# Altium schematic symbol library MCU_ST_STM32F4.SchLib: 211 symbols (part 8 of 10)
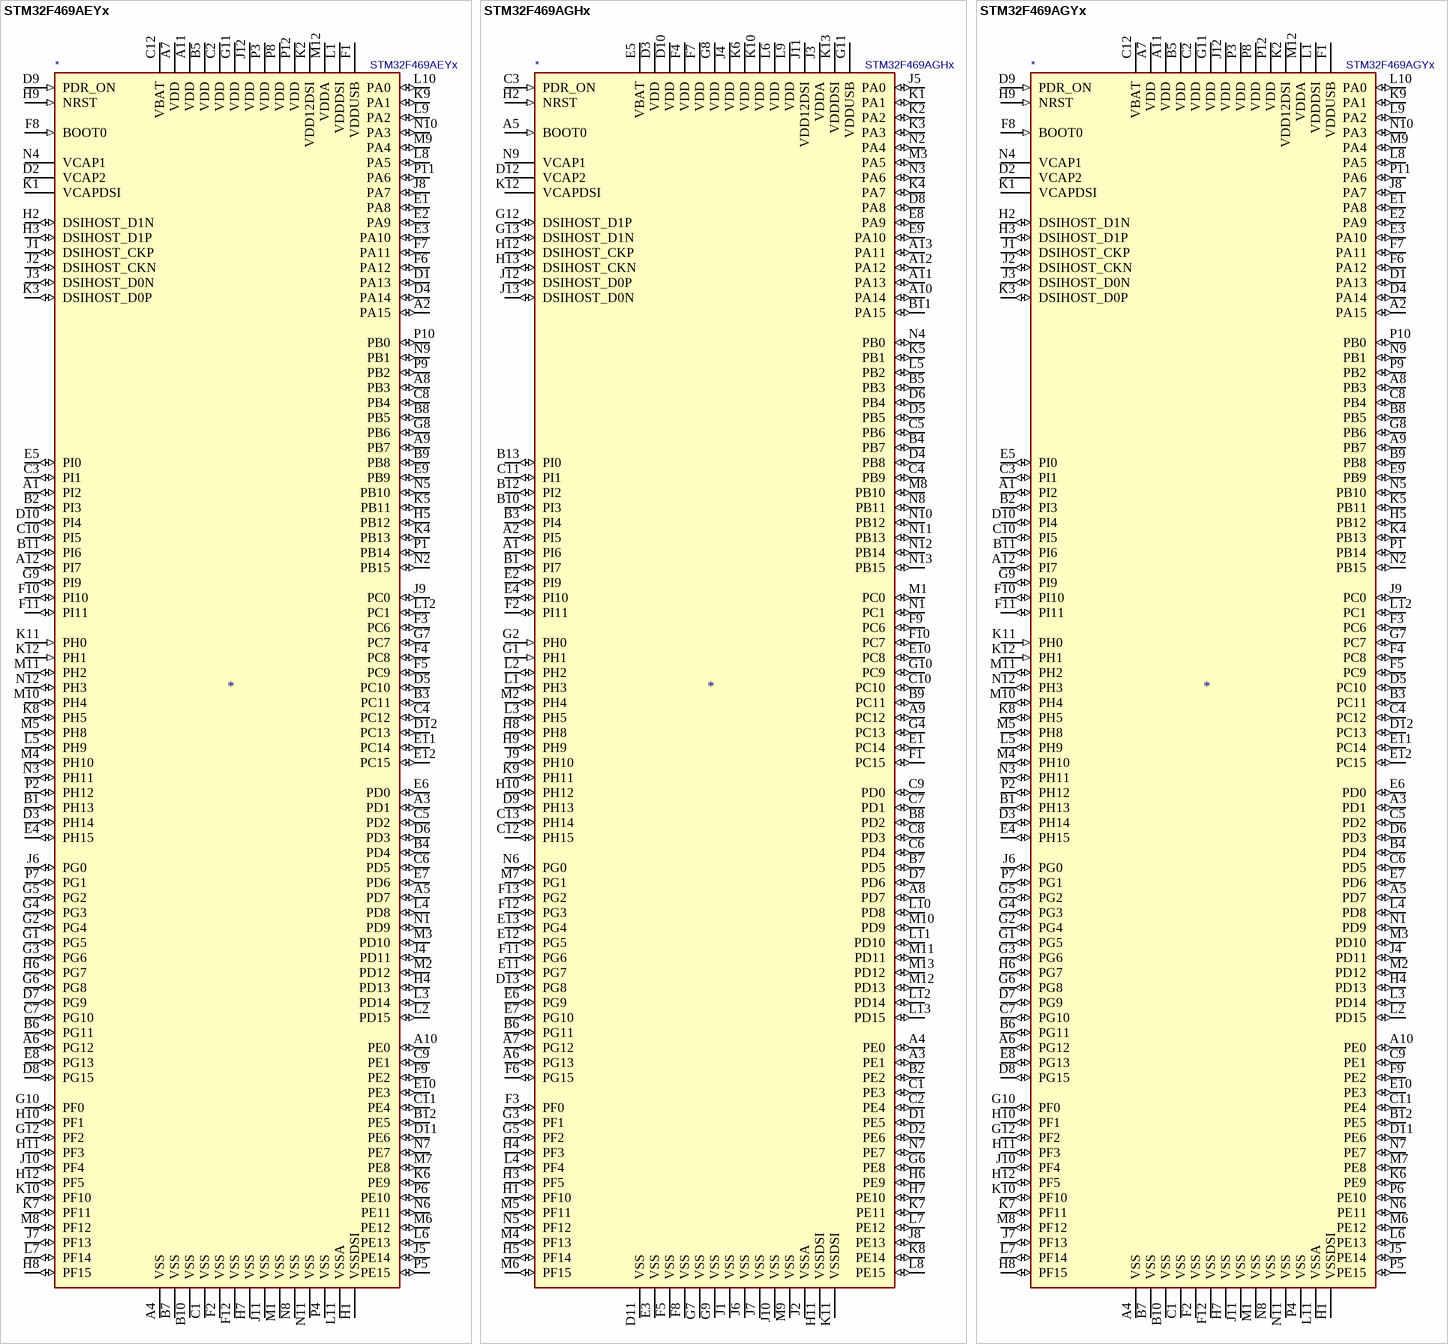
[diagram p69: symbols STM32F469AEYx to STM32F469AGYx]

## STM32F469AEYx
designator *  value STM32F469AEYx
ki_keywords: ARM Cortex-M4 STM32F4 STM32F469/479; ki_description: ARM Cortex-M4 MCU, 512KB flash, 320KB RAM, 180MHz, 1.7-3.6V, 128 GPIO, WLCSP-168; ki_fp_filters: ST_WLCSP*Die434*; Footprint: Package_CSP:ST_WLCSP-168_Die434; Supplier: http://www.st.com/st-web-ui/static/active/en/resource/technical/document/datasheet/DM00219980.pdf
footprint ST_WLCSP-168_Die434
pins: A1 PI2 (io), A2 PA15 (io), A3 PD1 (io), A4 VSS (power), A5 PD7 (io), A6 PG12 (io), A7 VDD (power), A8 PB3 (io), A9 PB7 (io), A10 PE0 (io), A11 VDD (power), A12 PI7 (io), B1 PH13 (io), B2 PI3 (io), B3 PC11 (io), B4 PD4 (io), B5 VDD (power), B6 PG11 (io), B7 VSS (power), B8 PB5 (io), B9 PB8 (io), B10 VSS (power), B11 PI6 (io), B12 PE5 (io), C1 VSS (power), C2 VDD (power), C3 PI1 (io), C4 PC12 (io), C5 PD2 (io), C6 PD5 (io), C7 PG10 (io), C8 PB4 (io), C9 PE1 (io), C10 PI5 (io), C11 PE4 (io), C12 VBAT (power), D1 PA13 (io), D2 VCAP2 (power), D3 PH14 (io), D4 PA14 (io), D5 PC10 (io), D6 PD3 (io), D7 PG9 (io), D8 PG15 (io), D9 PDR_ON (in), D10 PI4 (io), D11 PE6 (io), D12 PC13 (io), E1 PA8 (io), E2 PA9 (io), E3 PA10 (io), E4 PH15 (io), E5 PI0 (io), E6 PD0 (io), E7 PD6 (io), E8 PG13 (io), E9 PB9 (io), E10 PE3 (io), E11 PC14 (io), E12 PC15 (io), F1 VDDUSB (power), F2 VSS (power), F3 PC6 (io), F4 PC8 (io), F5 PC9 (io), F6 PA12 (io), F7 PA11 (io), F8 BOOT0 (in), F9 PE2 (io), F10 PI10 (io), F11 PI11 (io), F12 VSS (power), G1 PG5 (io), G2 PG4 (io), G3 PG6 (io), G4 PG3 (io), G5 PG2 (io), G6 PG8 (io), G7 PC7 (io), G8 PB6 (io), G9 PI9 (io), G10 PF0 (io), G11 VDD (power), G12 PF2 (io), H1 VSSDSI (power), H2 DSIHOST_D1N (io), H3 DSIHOST_D1P (io), H4 PD13 (io), H5 PB12 (io), H6 PG7 (io), H7 VSS (power), H8 PF15 (io), H9 NRST (in), H10 PF1 (io), H11 PF3 (io), H12 PF5 (io), J1 DSIHOST_CKP (io), J2 DSIHOST_CKN (io), J3 DSIHOST_D0N (io), J4 PD11 (io), J5 PE14 (io), J6 PG0 (io), J7 PF13 (io), J8 PA7 (io), J9 PC0 (io), J10 PF4 (io), J11 VSS (power), J12 VDD (power), K1 VCAPDSI (power), K2 VDD12DSI (power), K3 DSIHOST_D0P (io), K4 PB13 (io), K5 PB11 (io), K6 PE9 (io), K7 PF11 (io), K8 PH5 (io), K9 PA1 (io), K10 PF10 (io), K11 PH0 (in), K12 PH1 (in), L1 VDDDSI (power), L2 PD15 (io), L3 PD14 (io), L4 PD8 (io), L5 PH9 (io), L6 PE13 (io), L7 PF14 (io), L8 PA5 (io), L9 PA2 (io), L10 PA0 (io), L11 VSSA (power), L12 PC1 (io), M1 VSS (power), M2 PD12 (io), M3 PD10 (io), M4 PH10 (io), M5 PH8 (io), M6 PE12 (io), M7 PE8 (io), M8 PF12 (io), M9 PA4 (io), M10 PH4 (io), M11 PH2 (io), M12 VDDA (power), N1 PD9 (io), N2 PB15 (io), N3 PH11 (io), N4 VCAP1 (power), N5 PB10 (io), N6 PE11 (io), N7 PE7 (io), N8 VSS (power), N9 PB1 (io), N10 PA3 (io), N11 VSS (power), N12 PH3 (io), P1 PB14 (io), P2 PH12 (io), P3 VDD (power), P4 VSS (power), P5 PE15 (io), P6 PE10 (io), P7 PG1 (io), P8 VDD (power), P9 PB2 (io), P10 PB0 (io), P11 PA6 (io), P12 VDD (power)

## STM32F469AGHx
designator *  value STM32F469AGHx
ki_keywords: ARM Cortex-M4 STM32F4 STM32F469/479; ki_description: ARM Cortex-M4 MCU, 1024KB flash, 320KB RAM, 180MHz, 1.7-3.6V, 128 GPIO, UFBGA-169; ki_fp_filters: UFBGA*7x7mm*Layout13x13*P0.5mm*; Footprint: Package_BGA:UFBGA-169_7x7mm_Layout13x13_P0.5mm; Supplier: http://www.st.com/st-web-ui/static/active/en/resource/technical/document/datasheet/DM00219980.pdf
footprint UFBGA-169_7x7mm_Layout13x13_P0.5mm
pins: A1 PI6 (io), A2 PI5 (io), A3 PE1 (io), A4 PE0 (io), A5 BOOT0 (in), A6 PG13 (io), A7 PG12 (io), A8 PD7 (io), A9 PC12 (io), A10 PA14 (io), A11 PA13 (io), A12 PA12 (io), A13 PA11 (io), B1 PI7 (io), B2 PE2 (io), B3 PI4 (io), B4 PB7 (io), B5 PB3 (io), B6 PG11 (io), B7 PD5 (io), B8 PD2 (io), B9 PC11 (io), B10 PI3 (io), B11 PA15 (io), B12 PI2 (io), B13 PI0 (io), C1 PE3 (io), C2 PE4 (io), C3 PDR_ON (in), C4 PB9 (io), C5 PB6 (io), C6 PD4 (io), C7 PD1 (io), C8 PD3 (io), C9 PD0 (io), C10 PC10 (io), C11 PI1 (io), C12 PH15 (io), C13 PH14 (io), D1 PE5 (io), D2 PE6 (io), D3 VDD (power), D4 PB8 (io), D5 PB5 (io), D6 PB4 (io), D7 PD6 (io), D8 PA8 (io), D9 PH13 (io), D10 VDD (power), D11 VSS (power), D12 VCAP2 (power), D13 PG8 (io), E1 PC14 (io), E2 PI9 (io), E3 VSS (power), E4 PI10 (io), E5 VBAT (power), E6 PG9 (io), E7 PG10 (io), E8 PA9 (io), E9 PA10 (io), E10 PC8 (io), E11 PG7 (io), E12 PG5 (io), E13 PG4 (io), F1 PC15 (io), F2 PI11 (io), F3 PF0 (io), F4 VDD (power), F5 VSS (power), F6 PG15 (io), F7 VDD (power), F8 VSS (power), F9 PC6 (io), F10 PC7 (io), F11 PG6 (io), F12 PG3 (io), F13 PG2 (io), G1 PH1 (in), G2 PH0 (in), G3 PF1 (io), G4 PC13 (io), G5 PF2 (io), G6 PE8 (io), G7 VSS (power), G8 VDD (power), G9 VSS (power), G10 PC9 (io), G11 VDDUSB (power), G12 DSIHOST_D1P (io), G13 DSIHOST_D1N (io), H1 PF10 (io), H2 NRST (in), H3 PF5 (io), H4 PF3 (io), H5 PF14 (io), H6 PE9 (io), H7 PE10 (io), H8 PH8 (io), H9 PH9 (io), H10 PH12 (io), H11 VSSDSI (power), H12 DSIHOST_CKP (io), H13 DSIHOST_CKN (io), J1 VSS (power), J2 VSSA (power), J3 VDDA (power), J4 VDD (power), J5 PA0 (io), J6 VSS (power), J7 VSS (power), J8 PE13 (io), J9 PH10 (io), J10 VSS (power), J11 VDD12DSI (power), J12 DSIHOST_D0P (io), J13 DSIHOST_D0N (io), K1 PA1 (io), K2 PA2 (io), K3 PA3 (io), K4 PA7 (io), K5 PB1 (io), K6 VDD (power), K7 PE11 (io), K8 PE14 (io), K9 PH11 (io), K10 VDD (power), K11 VSSDSI (power), K12 VCAPDSI (power), K13 VDDDSI (power), L1 PH3 (io), L2 PH2 (io), L3 PH5 (io), L4 PF4 (io), L5 PB2 (io), L6 VDD (power), L7 PE12 (io), L8 PE15 (io), L9 VDD (power), L10 PD8 (io), L11 PD10 (io), L12 PD14 (io), L13 PD15 (io), M1 PC0 (io), M2 PH4 (io), M3 PA5 (io), M4 PF13 (io), M5 PF11 (io), M6 PF15 (io), M7 PG1 (io), M8 PB10 (io), M9 VSS (power), M10 PD9 (io), M11 PD11 (io), M12 PD13 (io), M13 PD12 (io), N1 PC1 (io), N2 PA4 (io), N3 PA6 (io), N4 PB0 (io), N5 PF12 (io), N6 PG0 (io), N7 PE7 (io), N8 PB11 (io), N9 VCAP1 (power), N10 PB12 (io), N11 PB13 (io), N12 PB14 (io), N13 PB15 (io)

## STM32F469AGYx
designator *  value STM32F469AGYx
ki_keywords: ARM Cortex-M4 STM32F4 STM32F469/479; ki_description: ARM Cortex-M4 MCU, 1024KB flash, 320KB RAM, 180MHz, 1.7-3.6V, 128 GPIO, WLCSP-168; ki_fp_filters: ST_WLCSP*Die434*; Footprint: Package_CSP:ST_WLCSP-168_Die434; Supplier: http://www.st.com/st-web-ui/static/active/en/resource/technical/document/datasheet/DM00219980.pdf
footprint ST_WLCSP-168_Die434
pins: A1 PI2 (io), A2 PA15 (io), A3 PD1 (io), A4 VSS (power), A5 PD7 (io), A6 PG12 (io), A7 VDD (power), A8 PB3 (io), A9 PB7 (io), A10 PE0 (io), A11 VDD (power), A12 PI7 (io), B1 PH13 (io), B2 PI3 (io), B3 PC11 (io), B4 PD4 (io), B5 VDD (power), B6 PG11 (io), B7 VSS (power), B8 PB5 (io), B9 PB8 (io), B10 VSS (power), B11 PI6 (io), B12 PE5 (io), C1 VSS (power), C2 VDD (power), C3 PI1 (io), C4 PC12 (io), C5 PD2 (io), C6 PD5 (io), C7 PG10 (io), C8 PB4 (io), C9 PE1 (io), C10 PI5 (io), C11 PE4 (io), C12 VBAT (power), D1 PA13 (io), D2 VCAP2 (power), D3 PH14 (io), D4 PA14 (io), D5 PC10 (io), D6 PD3 (io), D7 PG9 (io), D8 PG15 (io), D9 PDR_ON (in), D10 PI4 (io), D11 PE6 (io), D12 PC13 (io), E1 PA8 (io), E2 PA9 (io), E3 PA10 (io), E4 PH15 (io), E5 PI0 (io), E6 PD0 (io), E7 PD6 (io), E8 PG13 (io), E9 PB9 (io), E10 PE3 (io), E11 PC14 (io), E12 PC15 (io), F1 VDDUSB (power), F2 VSS (power), F3 PC6 (io), F4 PC8 (io), F5 PC9 (io), F6 PA12 (io), F7 PA11 (io), F8 BOOT0 (in), F9 PE2 (io), F10 PI10 (io), F11 PI11 (io), F12 VSS (power), G1 PG5 (io), G2 PG4 (io), G3 PG6 (io), G4 PG3 (io), G5 PG2 (io), G6 PG8 (io), G7 PC7 (io), G8 PB6 (io), G9 PI9 (io), G10 PF0 (io), G11 VDD (power), G12 PF2 (io), H1 VSSDSI (power), H2 DSIHOST_D1N (io), H3 DSIHOST_D1P (io), H4 PD13 (io), H5 PB12 (io), H6 PG7 (io), H7 VSS (power), H8 PF15 (io), H9 NRST (in), H10 PF1 (io), H11 PF3 (io), H12 PF5 (io), J1 DSIHOST_CKP (io), J2 DSIHOST_CKN (io), J3 DSIHOST_D0N (io), J4 PD11 (io), J5 PE14 (io), J6 PG0 (io), J7 PF13 (io), J8 PA7 (io), J9 PC0 (io), J10 PF4 (io), J11 VSS (power), J12 VDD (power), K1 VCAPDSI (power), K2 VDD12DSI (power), K3 DSIHOST_D0P (io), K4 PB13 (io), K5 PB11 (io), K6 PE9 (io), K7 PF11 (io), K8 PH5 (io), K9 PA1 (io), K10 PF10 (io), K11 PH0 (in), K12 PH1 (in), L1 VDDDSI (power), L2 PD15 (io), L3 PD14 (io), L4 PD8 (io), L5 PH9 (io), L6 PE13 (io), L7 PF14 (io), L8 PA5 (io), L9 PA2 (io), L10 PA0 (io), L11 VSSA (power), L12 PC1 (io), M1 VSS (power), M2 PD12 (io), M3 PD10 (io), M4 PH10 (io), M5 PH8 (io), M6 PE12 (io), M7 PE8 (io), M8 PF12 (io), M9 PA4 (io), M10 PH4 (io), M11 PH2 (io), M12 VDDA (power), N1 PD9 (io), N2 PB15 (io), N3 PH11 (io), N4 VCAP1 (power), N5 PB10 (io), N6 PE11 (io), N7 PE7 (io), N8 VSS (power), N9 PB1 (io), N10 PA3 (io), N11 VSS (power), N12 PH3 (io), P1 PB14 (io), P2 PH12 (io), P3 VDD (power), P4 VSS (power), P5 PE15 (io), P6 PE10 (io), P7 PG1 (io), P8 VDD (power), P9 PB2 (io), P10 PB0 (io), P11 PA6 (io), P12 VDD (power)

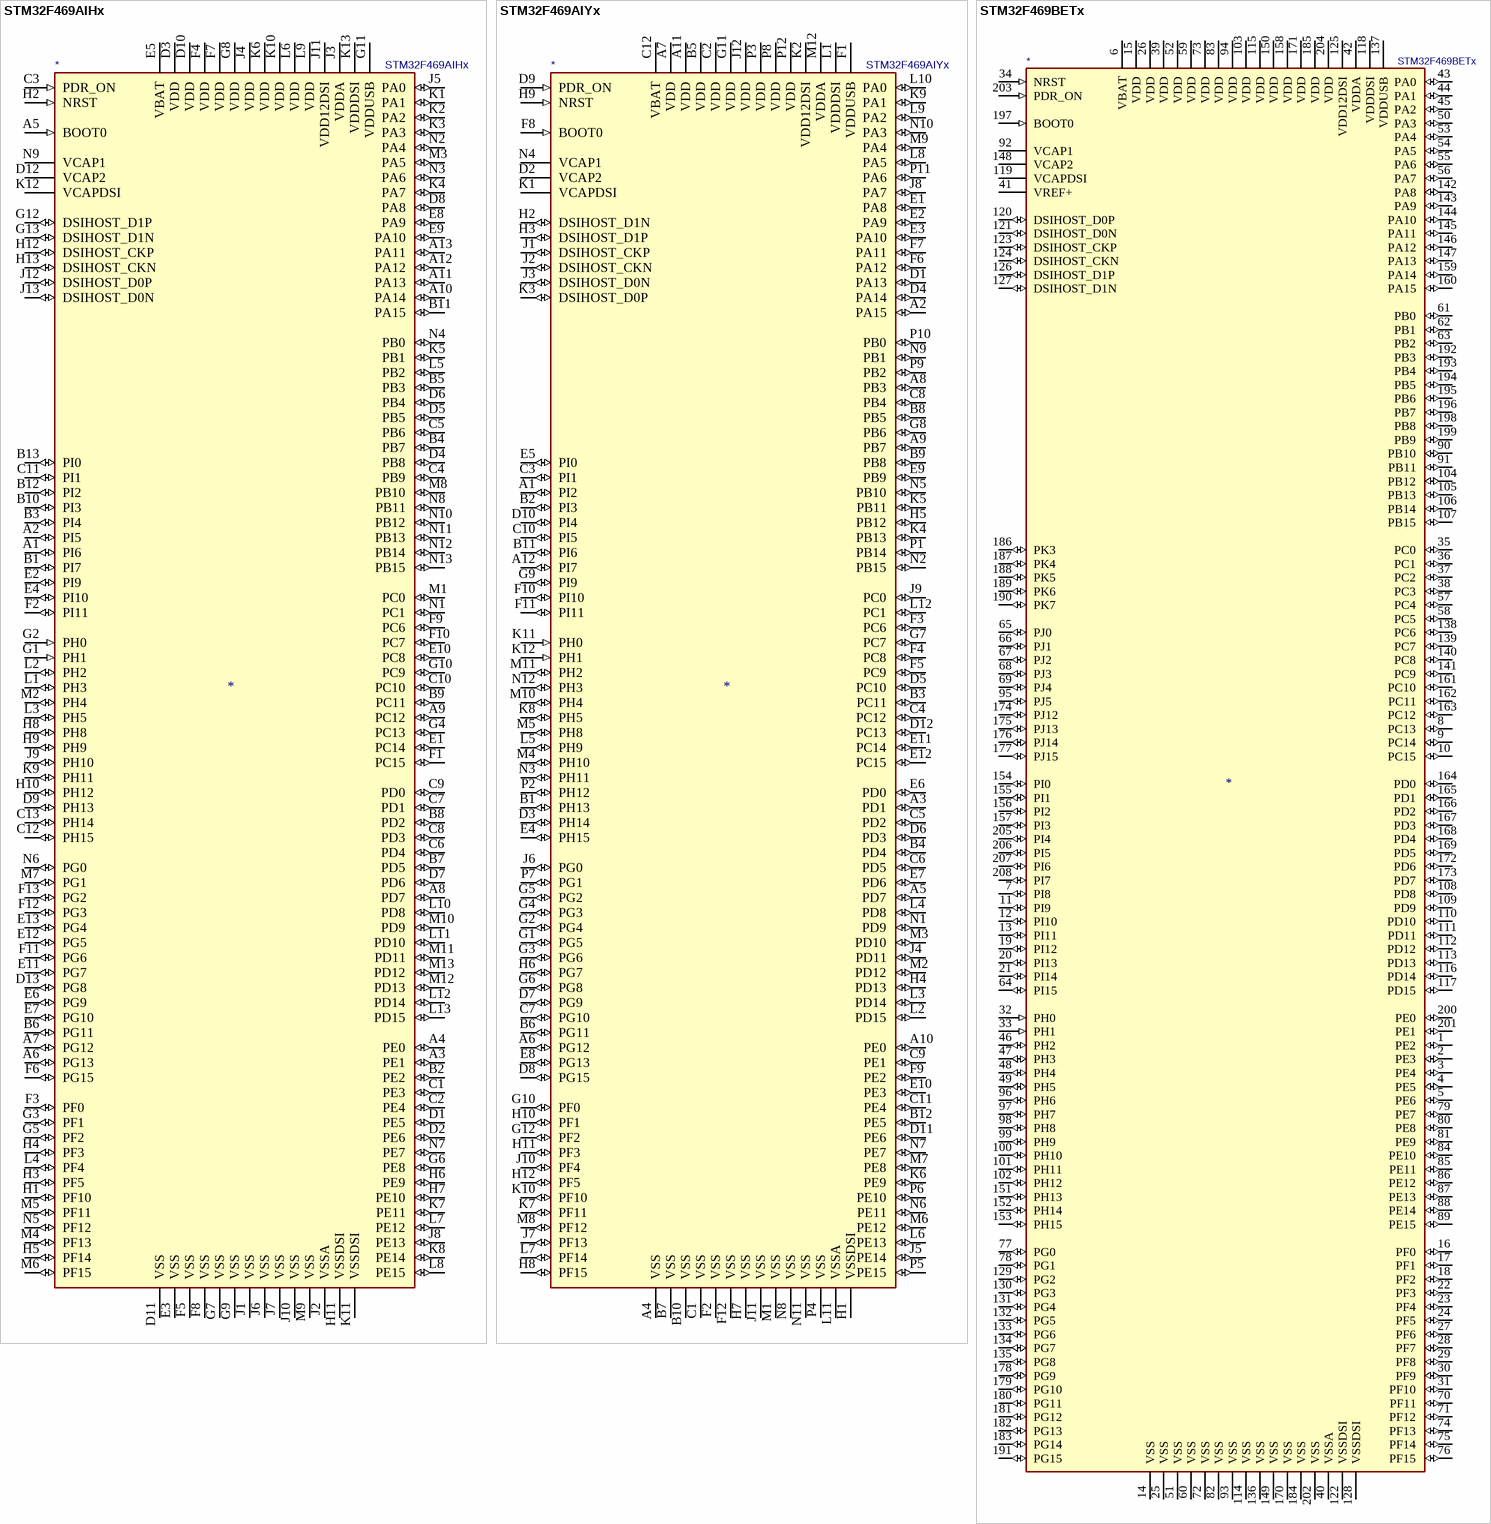
[diagram p48: symbols STM32F469AIHx to STM32F469BETx]

## STM32F469AIHx
designator *  value STM32F469AIHx
ki_keywords: ARM Cortex-M4 STM32F4 STM32F469/479; ki_description: ARM Cortex-M4 MCU, 2048KB flash, 320KB RAM, 180MHz, 1.7-3.6V, 128 GPIO, UFBGA-169; ki_fp_filters: UFBGA*7x7mm*Layout13x13*P0.5mm*; Footprint: Package_BGA:UFBGA-169_7x7mm_Layout13x13_P0.5mm; Supplier: http://www.st.com/st-web-ui/static/active/en/resource/technical/document/datasheet/DM00219980.pdf
footprint UFBGA-169_7x7mm_Layout13x13_P0.5mm
pins: A1 PI6 (io), A2 PI5 (io), A3 PE1 (io), A4 PE0 (io), A5 BOOT0 (in), A6 PG13 (io), A7 PG12 (io), A8 PD7 (io), A9 PC12 (io), A10 PA14 (io), A11 PA13 (io), A12 PA12 (io), A13 PA11 (io), B1 PI7 (io), B2 PE2 (io), B3 PI4 (io), B4 PB7 (io), B5 PB3 (io), B6 PG11 (io), B7 PD5 (io), B8 PD2 (io), B9 PC11 (io), B10 PI3 (io), B11 PA15 (io), B12 PI2 (io), B13 PI0 (io), C1 PE3 (io), C2 PE4 (io), C3 PDR_ON (in), C4 PB9 (io), C5 PB6 (io), C6 PD4 (io), C7 PD1 (io), C8 PD3 (io), C9 PD0 (io), C10 PC10 (io), C11 PI1 (io), C12 PH15 (io), C13 PH14 (io), D1 PE5 (io), D2 PE6 (io), D3 VDD (power), D4 PB8 (io), D5 PB5 (io), D6 PB4 (io), D7 PD6 (io), D8 PA8 (io), D9 PH13 (io), D10 VDD (power), D11 VSS (power), D12 VCAP2 (power), D13 PG8 (io), E1 PC14 (io), E2 PI9 (io), E3 VSS (power), E4 PI10 (io), E5 VBAT (power), E6 PG9 (io), E7 PG10 (io), E8 PA9 (io), E9 PA10 (io), E10 PC8 (io), E11 PG7 (io), E12 PG5 (io), E13 PG4 (io), F1 PC15 (io), F2 PI11 (io), F3 PF0 (io), F4 VDD (power), F5 VSS (power), F6 PG15 (io), F7 VDD (power), F8 VSS (power), F9 PC6 (io), F10 PC7 (io), F11 PG6 (io), F12 PG3 (io), F13 PG2 (io), G1 PH1 (in), G2 PH0 (in), G3 PF1 (io), G4 PC13 (io), G5 PF2 (io), G6 PE8 (io), G7 VSS (power), G8 VDD (power), G9 VSS (power), G10 PC9 (io), G11 VDDUSB (power), G12 DSIHOST_D1P (io), G13 DSIHOST_D1N (io), H1 PF10 (io), H2 NRST (in), H3 PF5 (io), H4 PF3 (io), H5 PF14 (io), H6 PE9 (io), H7 PE10 (io), H8 PH8 (io), H9 PH9 (io), H10 PH12 (io), H11 VSSDSI (power), H12 DSIHOST_CKP (io), H13 DSIHOST_CKN (io), J1 VSS (power), J2 VSSA (power), J3 VDDA (power), J4 VDD (power), J5 PA0 (io), J6 VSS (power), J7 VSS (power), J8 PE13 (io), J9 PH10 (io), J10 VSS (power), J11 VDD12DSI (power), J12 DSIHOST_D0P (io), J13 DSIHOST_D0N (io), K1 PA1 (io), K2 PA2 (io), K3 PA3 (io), K4 PA7 (io), K5 PB1 (io), K6 VDD (power), K7 PE11 (io), K8 PE14 (io), K9 PH11 (io), K10 VDD (power), K11 VSSDSI (power), K12 VCAPDSI (power), K13 VDDDSI (power), L1 PH3 (io), L2 PH2 (io), L3 PH5 (io), L4 PF4 (io), L5 PB2 (io), L6 VDD (power), L7 PE12 (io), L8 PE15 (io), L9 VDD (power), L10 PD8 (io), L11 PD10 (io), L12 PD14 (io), L13 PD15 (io), M1 PC0 (io), M2 PH4 (io), M3 PA5 (io), M4 PF13 (io), M5 PF11 (io), M6 PF15 (io), M7 PG1 (io), M8 PB10 (io), M9 VSS (power), M10 PD9 (io), M11 PD11 (io), M12 PD13 (io), M13 PD12 (io), N1 PC1 (io), N2 PA4 (io), N3 PA6 (io), N4 PB0 (io), N5 PF12 (io), N6 PG0 (io), N7 PE7 (io), N8 PB11 (io), N9 VCAP1 (power), N10 PB12 (io), N11 PB13 (io), N12 PB14 (io), N13 PB15 (io)

## STM32F469AIYx
designator *  value STM32F469AIYx
ki_keywords: ARM Cortex-M4 STM32F4 STM32F469/479; ki_description: ARM Cortex-M4 MCU, 2048KB flash, 320KB RAM, 180MHz, 1.7-3.6V, 128 GPIO, WLCSP-168; ki_fp_filters: ST_WLCSP*Die434*; Footprint: Package_CSP:ST_WLCSP-168_Die434; Supplier: http://www.st.com/st-web-ui/static/active/en/resource/technical/document/datasheet/DM00219980.pdf
footprint ST_WLCSP-168_Die434
pins: A1 PI2 (io), A2 PA15 (io), A3 PD1 (io), A4 VSS (power), A5 PD7 (io), A6 PG12 (io), A7 VDD (power), A8 PB3 (io), A9 PB7 (io), A10 PE0 (io), A11 VDD (power), A12 PI7 (io), B1 PH13 (io), B2 PI3 (io), B3 PC11 (io), B4 PD4 (io), B5 VDD (power), B6 PG11 (io), B7 VSS (power), B8 PB5 (io), B9 PB8 (io), B10 VSS (power), B11 PI6 (io), B12 PE5 (io), C1 VSS (power), C2 VDD (power), C3 PI1 (io), C4 PC12 (io), C5 PD2 (io), C6 PD5 (io), C7 PG10 (io), C8 PB4 (io), C9 PE1 (io), C10 PI5 (io), C11 PE4 (io), C12 VBAT (power), D1 PA13 (io), D2 VCAP2 (power), D3 PH14 (io), D4 PA14 (io), D5 PC10 (io), D6 PD3 (io), D7 PG9 (io), D8 PG15 (io), D9 PDR_ON (in), D10 PI4 (io), D11 PE6 (io), D12 PC13 (io), E1 PA8 (io), E2 PA9 (io), E3 PA10 (io), E4 PH15 (io), E5 PI0 (io), E6 PD0 (io), E7 PD6 (io), E8 PG13 (io), E9 PB9 (io), E10 PE3 (io), E11 PC14 (io), E12 PC15 (io), F1 VDDUSB (power), F2 VSS (power), F3 PC6 (io), F4 PC8 (io), F5 PC9 (io), F6 PA12 (io), F7 PA11 (io), F8 BOOT0 (in), F9 PE2 (io), F10 PI10 (io), F11 PI11 (io), F12 VSS (power), G1 PG5 (io), G2 PG4 (io), G3 PG6 (io), G4 PG3 (io), G5 PG2 (io), G6 PG8 (io), G7 PC7 (io), G8 PB6 (io), G9 PI9 (io), G10 PF0 (io), G11 VDD (power), G12 PF2 (io), H1 VSSDSI (power), H2 DSIHOST_D1N (io), H3 DSIHOST_D1P (io), H4 PD13 (io), H5 PB12 (io), H6 PG7 (io), H7 VSS (power), H8 PF15 (io), H9 NRST (in), H10 PF1 (io), H11 PF3 (io), H12 PF5 (io), J1 DSIHOST_CKP (io), J2 DSIHOST_CKN (io), J3 DSIHOST_D0N (io), J4 PD11 (io), J5 PE14 (io), J6 PG0 (io), J7 PF13 (io), J8 PA7 (io), J9 PC0 (io), J10 PF4 (io), J11 VSS (power), J12 VDD (power), K1 VCAPDSI (power), K2 VDD12DSI (power), K3 DSIHOST_D0P (io), K4 PB13 (io), K5 PB11 (io), K6 PE9 (io), K7 PF11 (io), K8 PH5 (io), K9 PA1 (io), K10 PF10 (io), K11 PH0 (in), K12 PH1 (in), L1 VDDDSI (power), L2 PD15 (io), L3 PD14 (io), L4 PD8 (io), L5 PH9 (io), L6 PE13 (io), L7 PF14 (io), L8 PA5 (io), L9 PA2 (io), L10 PA0 (io), L11 VSSA (power), L12 PC1 (io), M1 VSS (power), M2 PD12 (io), M3 PD10 (io), M4 PH10 (io), M5 PH8 (io), M6 PE12 (io), M7 PE8 (io), M8 PF12 (io), M9 PA4 (io), M10 PH4 (io), M11 PH2 (io), M12 VDDA (power), N1 PD9 (io), N2 PB15 (io), N3 PH11 (io), N4 VCAP1 (power), N5 PB10 (io), N6 PE11 (io), N7 PE7 (io), N8 VSS (power), N9 PB1 (io), N10 PA3 (io), N11 VSS (power), N12 PH3 (io), P1 PB14 (io), P2 PH12 (io), P3 VDD (power), P4 VSS (power), P5 PE15 (io), P6 PE10 (io), P7 PG1 (io), P8 VDD (power), P9 PB2 (io), P10 PB0 (io), P11 PA6 (io), P12 VDD (power)

## STM32F469BETx
designator *  value STM32F469BETx
ki_keywords: ARM Cortex-M4 STM32F4 STM32F469/479; ki_description: ARM Cortex-M4 MCU, 512KB flash, 320KB RAM, 180MHz, 1.7-3.6V, 159 GPIO, LQFP-208; ki_fp_filters: LQFP*28x28mm*P0.5mm*; Footprint: Package_QFP:LQFP-208_28x28mm_P0.5mm; Supplier: http://www.st.com/st-web-ui/static/active/en/resource/technical/document/datasheet/DM00219980.pdf
footprint LQFP-208_28x28mm_P0.5mm
pins: 1 PE2 (io), 2 PE3 (io), 3 PE4 (io), 4 PE5 (io), 5 PE6 (io), 6 VBAT (power), 7 PI8 (io), 8 PC13 (io), 9 PC14 (io), 10 PC15 (io), 11 PI9 (io), 12 PI10 (io), 13 PI11 (io), 14 VSS (power), 15 VDD (power), 16 PF0 (io), 17 PF1 (io), 18 PF2 (io), 19 PI12 (io), 20 PI13 (io), 21 PI14 (io), 22 PF3 (io), 23 PF4 (io), 24 PF5 (io), 25 VSS (power), 26 VDD (power), 27 PF6 (io), 28 PF7 (io), 29 PF8 (io), 30 PF9 (io), 31 PF10 (io), 32 PH0 (in), 33 PH1 (in), 34 NRST (in), 35 PC0 (io), 36 PC1 (io), 37 PC2 (io), 38 PC3 (io), 39 VDD (power), 40 VSSA (power), 41 VREF+ (power), 42 VDDA (power), 43 PA0 (io), 44 PA1 (io), 45 PA2 (io), 46 PH2 (io), 47 PH3 (io), 48 PH4 (io), 49 PH5 (io), 50 PA3 (io), 51 VSS (power), 52 VDD (power), 53 PA4 (io), 54 PA5 (io), 55 PA6 (io), 56 PA7 (io), 57 PC4 (io), 58 PC5 (io), 59 VDD (power), 60 VSS (power), 61 PB0 (io), 62 PB1 (io), 63 PB2 (io), 64 PI15 (io), 65 PJ0 (io), 66 PJ1 (io), 67 PJ2 (io), 68 PJ3 (io), 69 PJ4 (io), 70 PF11 (io), 71 PF12 (io), 72 VSS (power), 73 VDD (power), 74 PF13 (io), 75 PF14 (io), 76 PF15 (io), 77 PG0 (io), 78 PG1 (io), 79 PE7 (io), 80 PE8 (io), 81 PE9 (io), 82 VSS (power), 83 VDD (power), 84 PE10 (io), 85 PE11 (io), 86 PE12 (io), 87 PE13 (io), 88 PE14 (io), 89 PE15 (io), 90 PB10 (io), 91 PB11 (io), 92 VCAP1 (power), 93 VSS (power), 94 VDD (power), 95 PJ5 (io), 96 PH6 (io), 97 PH7 (io), 98 PH8 (io), 99 PH9 (io), 100 PH10 (io), 101 PH11 (io), 102 PH12 (io), 103 VDD (power), 104 PB12 (io), 105 PB13 (io), 106 PB14 (io), 107 PB15 (io), 108 PD8 (io), 109 PD9 (io), 110 PD10 (io), 111 PD11 (io), 112 PD12 (io), 113 PD13 (io), 114 VSS (power), 115 VDD (power), 116 PD14 (io), 117 PD15 (io), 118 VDDDSI (power), 119 VCAPDSI (power), 120 DSIHOST_D0P (io), 121 DSIHOST_D0N (io), 122 VSSDSI (power), 123 DSIHOST_CKP (io), 124 DSIHOST_CKN (io), 125 VDD12DSI (power), 126 DSIHOST_D1P (io), 127 DSIHOST_D1N (io), 128 VSSDSI (power), 129 PG2 (io), 130 PG3 (io), 131 PG4 (io), 132 PG5 (io), 133 PG6 (io), 134 PG7 (io), 135 PG8 (io), 136 VSS (power), 137 VDDUSB (power), 138 PC6 (io), 139 PC7 (io), 140 PC8 (io), 141 PC9 (io), 142 PA8 (io), 143 PA9 (io), 144 PA10 (io), 145 PA11 (io), 146 PA12 (io), 147 PA13 (io), 148 VCAP2 (power), 149 VSS (power), 150 VDD (power), 151 PH13 (io), 152 PH14 (io), 153 PH15 (io), 154 PI0 (io), 155 PI1 (io), 156 PI2 (io), 157 PI3 (io), 158 VDD (power), 159 PA14 (io), 160 PA15 (io), 161 PC10 (io), 162 PC11 (io), 163 PC12 (io), 164 PD0 (io), 165 PD1 (io), 166 PD2 (io), 167 PD3 (io), 168 PD4 (io), 169 PD5 (io), 170 VSS (power), 171 VDD (power), 172 PD6 (io), 173 PD7 (io), 174 PJ12 (io), 175 PJ13 (io), 176 PJ14 (io), 177 PJ15 (io), 178 PG9 (io), 179 PG10 (io), 180 PG11 (io), 181 PG12 (io), 182 PG13 (io), 183 PG14 (io), 184 VSS (power), 185 VDD (power), 186 PK3 (io), 187 PK4 (io), 188 PK5 (io), 189 PK6 (io), 190 PK7 (io), 191 PG15 (io), 192 PB3 (io), 193 PB4 (io), 194 PB5 (io), 195 PB6 (io), 196 PB7 (io), 197 BOOT0 (in), 198 PB8 (io), 199 PB9 (io), 200 PE0 (io), 201 PE1 (io), 202 VSS (power), 203 PDR_ON (in), 204 VDD (power), 205 PI4 (io), 206 PI5 (io), 207 PI6 (io), 208 PI7 (io)

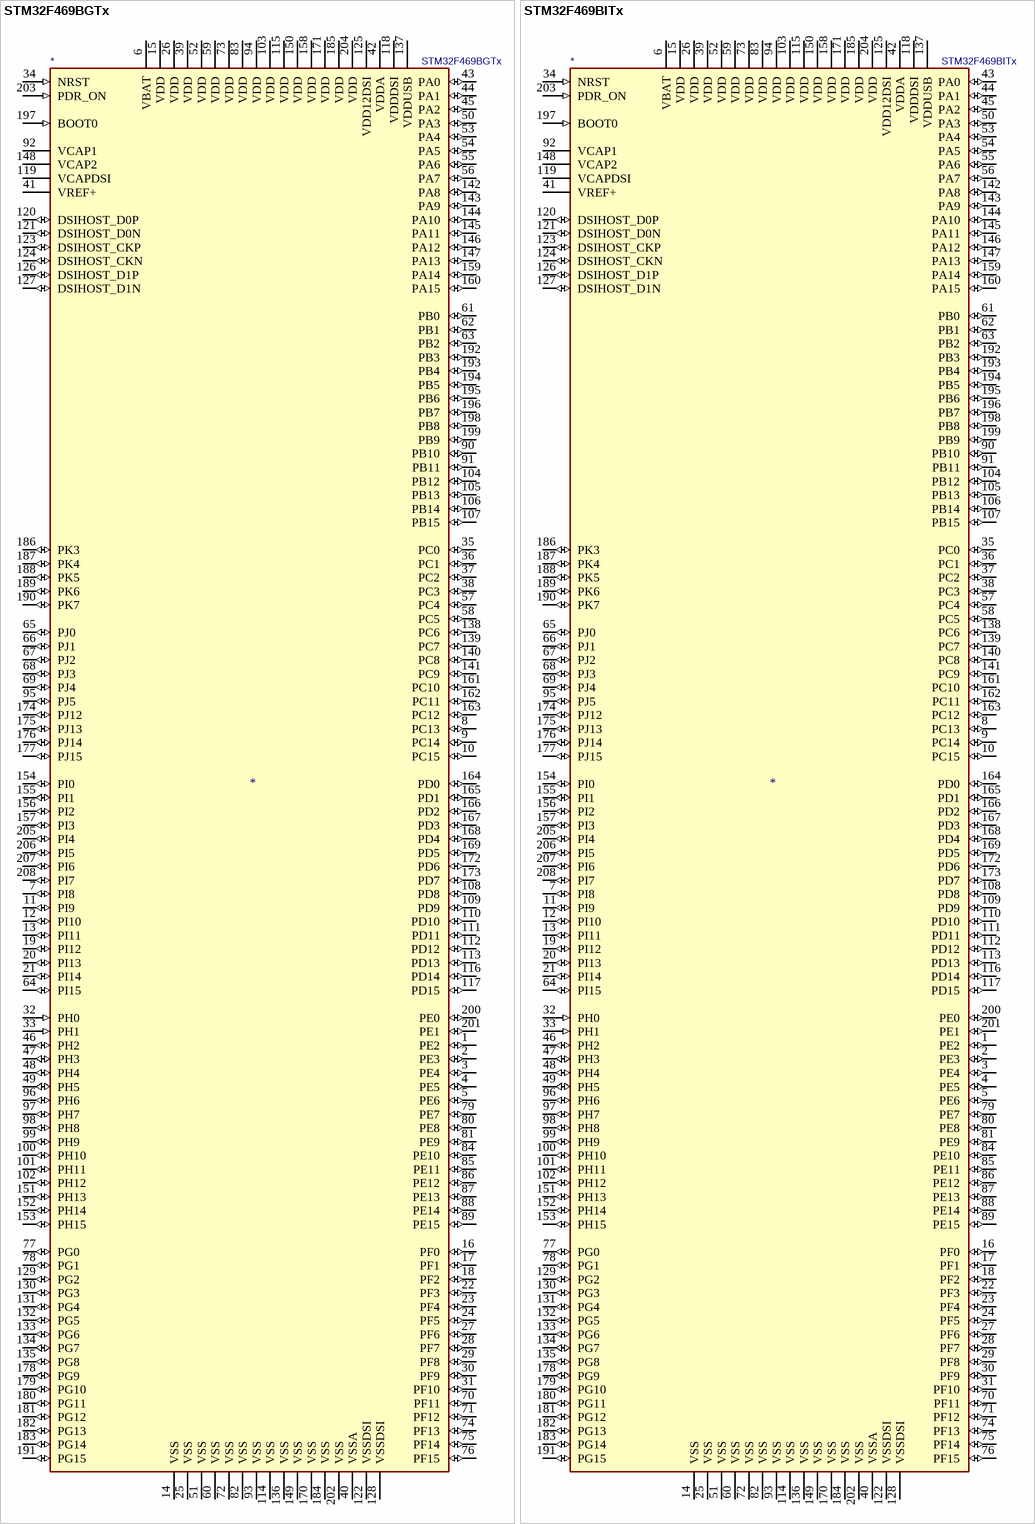
[diagram p49: symbols STM32F469BGTx to STM32F469BITx]

## STM32F469BGTx
designator *  value STM32F469BGTx
ki_keywords: ARM Cortex-M4 STM32F4 STM32F469/479; ki_description: ARM Cortex-M4 MCU, 1024KB flash, 320KB RAM, 180MHz, 1.7-3.6V, 159 GPIO, LQFP-208; ki_fp_filters: LQFP*28x28mm*P0.5mm*; Footprint: Package_QFP:LQFP-208_28x28mm_P0.5mm; Supplier: http://www.st.com/st-web-ui/static/active/en/resource/technical/document/datasheet/DM00219980.pdf
footprint LQFP-208_28x28mm_P0.5mm
pins: 1 PE2 (io), 2 PE3 (io), 3 PE4 (io), 4 PE5 (io), 5 PE6 (io), 6 VBAT (power), 7 PI8 (io), 8 PC13 (io), 9 PC14 (io), 10 PC15 (io), 11 PI9 (io), 12 PI10 (io), 13 PI11 (io), 14 VSS (power), 15 VDD (power), 16 PF0 (io), 17 PF1 (io), 18 PF2 (io), 19 PI12 (io), 20 PI13 (io), 21 PI14 (io), 22 PF3 (io), 23 PF4 (io), 24 PF5 (io), 25 VSS (power), 26 VDD (power), 27 PF6 (io), 28 PF7 (io), 29 PF8 (io), 30 PF9 (io), 31 PF10 (io), 32 PH0 (in), 33 PH1 (in), 34 NRST (in), 35 PC0 (io), 36 PC1 (io), 37 PC2 (io), 38 PC3 (io), 39 VDD (power), 40 VSSA (power), 41 VREF+ (power), 42 VDDA (power), 43 PA0 (io), 44 PA1 (io), 45 PA2 (io), 46 PH2 (io), 47 PH3 (io), 48 PH4 (io), 49 PH5 (io), 50 PA3 (io), 51 VSS (power), 52 VDD (power), 53 PA4 (io), 54 PA5 (io), 55 PA6 (io), 56 PA7 (io), 57 PC4 (io), 58 PC5 (io), 59 VDD (power), 60 VSS (power), 61 PB0 (io), 62 PB1 (io), 63 PB2 (io), 64 PI15 (io), 65 PJ0 (io), 66 PJ1 (io), 67 PJ2 (io), 68 PJ3 (io), 69 PJ4 (io), 70 PF11 (io), 71 PF12 (io), 72 VSS (power), 73 VDD (power), 74 PF13 (io), 75 PF14 (io), 76 PF15 (io), 77 PG0 (io), 78 PG1 (io), 79 PE7 (io), 80 PE8 (io), 81 PE9 (io), 82 VSS (power), 83 VDD (power), 84 PE10 (io), 85 PE11 (io), 86 PE12 (io), 87 PE13 (io), 88 PE14 (io), 89 PE15 (io), 90 PB10 (io), 91 PB11 (io), 92 VCAP1 (power), 93 VSS (power), 94 VDD (power), 95 PJ5 (io), 96 PH6 (io), 97 PH7 (io), 98 PH8 (io), 99 PH9 (io), 100 PH10 (io), 101 PH11 (io), 102 PH12 (io), 103 VDD (power), 104 PB12 (io), 105 PB13 (io), 106 PB14 (io), 107 PB15 (io), 108 PD8 (io), 109 PD9 (io), 110 PD10 (io), 111 PD11 (io), 112 PD12 (io), 113 PD13 (io), 114 VSS (power), 115 VDD (power), 116 PD14 (io), 117 PD15 (io), 118 VDDDSI (power), 119 VCAPDSI (power), 120 DSIHOST_D0P (io), 121 DSIHOST_D0N (io), 122 VSSDSI (power), 123 DSIHOST_CKP (io), 124 DSIHOST_CKN (io), 125 VDD12DSI (power), 126 DSIHOST_D1P (io), 127 DSIHOST_D1N (io), 128 VSSDSI (power), 129 PG2 (io), 130 PG3 (io), 131 PG4 (io), 132 PG5 (io), 133 PG6 (io), 134 PG7 (io), 135 PG8 (io), 136 VSS (power), 137 VDDUSB (power), 138 PC6 (io), 139 PC7 (io), 140 PC8 (io), 141 PC9 (io), 142 PA8 (io), 143 PA9 (io), 144 PA10 (io), 145 PA11 (io), 146 PA12 (io), 147 PA13 (io), 148 VCAP2 (power), 149 VSS (power), 150 VDD (power), 151 PH13 (io), 152 PH14 (io), 153 PH15 (io), 154 PI0 (io), 155 PI1 (io), 156 PI2 (io), 157 PI3 (io), 158 VDD (power), 159 PA14 (io), 160 PA15 (io), 161 PC10 (io), 162 PC11 (io), 163 PC12 (io), 164 PD0 (io), 165 PD1 (io), 166 PD2 (io), 167 PD3 (io), 168 PD4 (io), 169 PD5 (io), 170 VSS (power), 171 VDD (power), 172 PD6 (io), 173 PD7 (io), 174 PJ12 (io), 175 PJ13 (io), 176 PJ14 (io), 177 PJ15 (io), 178 PG9 (io), 179 PG10 (io), 180 PG11 (io), 181 PG12 (io), 182 PG13 (io), 183 PG14 (io), 184 VSS (power), 185 VDD (power), 186 PK3 (io), 187 PK4 (io), 188 PK5 (io), 189 PK6 (io), 190 PK7 (io), 191 PG15 (io), 192 PB3 (io), 193 PB4 (io), 194 PB5 (io), 195 PB6 (io), 196 PB7 (io), 197 BOOT0 (in), 198 PB8 (io), 199 PB9 (io), 200 PE0 (io), 201 PE1 (io), 202 VSS (power), 203 PDR_ON (in), 204 VDD (power), 205 PI4 (io), 206 PI5 (io), 207 PI6 (io), 208 PI7 (io)

## STM32F469BITx
designator *  value STM32F469BITx
ki_keywords: ARM Cortex-M4 STM32F4 STM32F469/479; ki_description: ARM Cortex-M4 MCU, 2048KB flash, 320KB RAM, 180MHz, 1.7-3.6V, 159 GPIO, LQFP-208; ki_fp_filters: LQFP*28x28mm*P0.5mm*; Footprint: Package_QFP:LQFP-208_28x28mm_P0.5mm; Supplier: http://www.st.com/st-web-ui/static/active/en/resource/technical/document/datasheet/DM00219980.pdf
footprint LQFP-208_28x28mm_P0.5mm
pins: 1 PE2 (io), 2 PE3 (io), 3 PE4 (io), 4 PE5 (io), 5 PE6 (io), 6 VBAT (power), 7 PI8 (io), 8 PC13 (io), 9 PC14 (io), 10 PC15 (io), 11 PI9 (io), 12 PI10 (io), 13 PI11 (io), 14 VSS (power), 15 VDD (power), 16 PF0 (io), 17 PF1 (io), 18 PF2 (io), 19 PI12 (io), 20 PI13 (io), 21 PI14 (io), 22 PF3 (io), 23 PF4 (io), 24 PF5 (io), 25 VSS (power), 26 VDD (power), 27 PF6 (io), 28 PF7 (io), 29 PF8 (io), 30 PF9 (io), 31 PF10 (io), 32 PH0 (in), 33 PH1 (in), 34 NRST (in), 35 PC0 (io), 36 PC1 (io), 37 PC2 (io), 38 PC3 (io), 39 VDD (power), 40 VSSA (power), 41 VREF+ (power), 42 VDDA (power), 43 PA0 (io), 44 PA1 (io), 45 PA2 (io), 46 PH2 (io), 47 PH3 (io), 48 PH4 (io), 49 PH5 (io), 50 PA3 (io), 51 VSS (power), 52 VDD (power), 53 PA4 (io), 54 PA5 (io), 55 PA6 (io), 56 PA7 (io), 57 PC4 (io), 58 PC5 (io), 59 VDD (power), 60 VSS (power), 61 PB0 (io), 62 PB1 (io), 63 PB2 (io), 64 PI15 (io), 65 PJ0 (io), 66 PJ1 (io), 67 PJ2 (io), 68 PJ3 (io), 69 PJ4 (io), 70 PF11 (io), 71 PF12 (io), 72 VSS (power), 73 VDD (power), 74 PF13 (io), 75 PF14 (io), 76 PF15 (io), 77 PG0 (io), 78 PG1 (io), 79 PE7 (io), 80 PE8 (io), 81 PE9 (io), 82 VSS (power), 83 VDD (power), 84 PE10 (io), 85 PE11 (io), 86 PE12 (io), 87 PE13 (io), 88 PE14 (io), 89 PE15 (io), 90 PB10 (io), 91 PB11 (io), 92 VCAP1 (power), 93 VSS (power), 94 VDD (power), 95 PJ5 (io), 96 PH6 (io), 97 PH7 (io), 98 PH8 (io), 99 PH9 (io), 100 PH10 (io), 101 PH11 (io), 102 PH12 (io), 103 VDD (power), 104 PB12 (io), 105 PB13 (io), 106 PB14 (io), 107 PB15 (io), 108 PD8 (io), 109 PD9 (io), 110 PD10 (io), 111 PD11 (io), 112 PD12 (io), 113 PD13 (io), 114 VSS (power), 115 VDD (power), 116 PD14 (io), 117 PD15 (io), 118 VDDDSI (power), 119 VCAPDSI (power), 120 DSIHOST_D0P (io), 121 DSIHOST_D0N (io), 122 VSSDSI (power), 123 DSIHOST_CKP (io), 124 DSIHOST_CKN (io), 125 VDD12DSI (power), 126 DSIHOST_D1P (io), 127 DSIHOST_D1N (io), 128 VSSDSI (power), 129 PG2 (io), 130 PG3 (io), 131 PG4 (io), 132 PG5 (io), 133 PG6 (io), 134 PG7 (io), 135 PG8 (io), 136 VSS (power), 137 VDDUSB (power), 138 PC6 (io), 139 PC7 (io), 140 PC8 (io), 141 PC9 (io), 142 PA8 (io), 143 PA9 (io), 144 PA10 (io), 145 PA11 (io), 146 PA12 (io), 147 PA13 (io), 148 VCAP2 (power), 149 VSS (power), 150 VDD (power), 151 PH13 (io), 152 PH14 (io), 153 PH15 (io), 154 PI0 (io), 155 PI1 (io), 156 PI2 (io), 157 PI3 (io), 158 VDD (power), 159 PA14 (io), 160 PA15 (io), 161 PC10 (io), 162 PC11 (io), 163 PC12 (io), 164 PD0 (io), 165 PD1 (io), 166 PD2 (io), 167 PD3 (io), 168 PD4 (io), 169 PD5 (io), 170 VSS (power), 171 VDD (power), 172 PD6 (io), 173 PD7 (io), 174 PJ12 (io), 175 PJ13 (io), 176 PJ14 (io), 177 PJ15 (io), 178 PG9 (io), 179 PG10 (io), 180 PG11 (io), 181 PG12 (io), 182 PG13 (io), 183 PG14 (io), 184 VSS (power), 185 VDD (power), 186 PK3 (io), 187 PK4 (io), 188 PK5 (io), 189 PK6 (io), 190 PK7 (io), 191 PG15 (io), 192 PB3 (io), 193 PB4 (io), 194 PB5 (io), 195 PB6 (io), 196 PB7 (io), 197 BOOT0 (in), 198 PB8 (io), 199 PB9 (io), 200 PE0 (io), 201 PE1 (io), 202 VSS (power), 203 PDR_ON (in), 204 VDD (power), 205 PI4 (io), 206 PI5 (io), 207 PI6 (io), 208 PI7 (io)

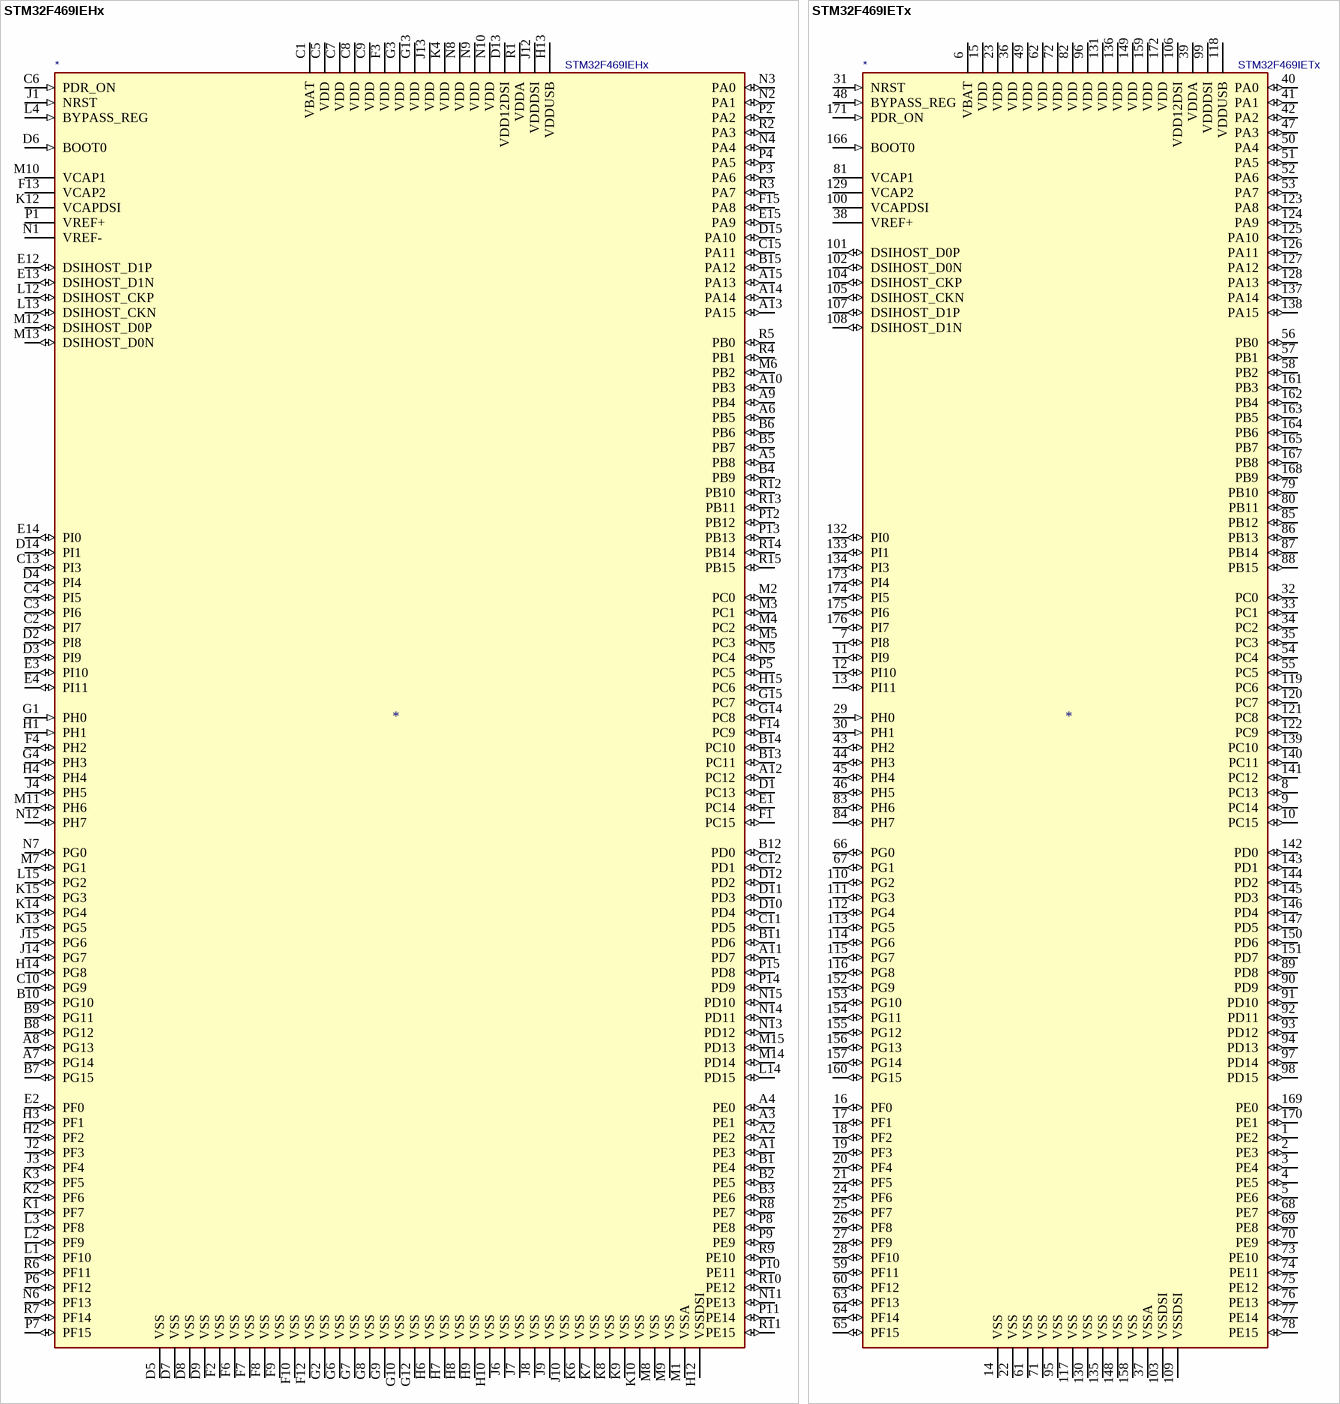
[diagram p50: symbols STM32F469IEHx to STM32F469IETx]

## STM32F469IEHx
designator *  value STM32F469IEHx
ki_keywords: ARM Cortex-M4 STM32F4 STM32F469/479; ki_description: ARM Cortex-M4 MCU, 512KB flash, 320KB RAM, 180MHz, 1.7-3.6V, 131 GPIO, UFBGA-176; ki_fp_filters: UFBGA*10x10mm*Layout15x15*P0.65mm*; Footprint: Package_BGA:UFBGA-201_10x10mm_Layout15x15_P0.65mm; Supplier: http://www.st.com/st-web-ui/static/active/en/resource/technical/document/datasheet/DM00219980.pdf
footprint UFBGA-201_10x10mm_Layout15x15_P0.65mm
pins: A1 PE3 (io), A2 PE2 (io), A3 PE1 (io), A4 PE0 (io), A5 PB8 (io), A6 PB5 (io), A7 PG14 (io), A8 PG13 (io), A9 PB4 (io), A10 PB3 (io), A11 PD7 (io), A12 PC12 (io), A13 PA15 (io), A14 PA14 (io), A15 PA13 (io), B1 PE4 (io), B2 PE5 (io), B3 PE6 (io), B4 PB9 (io), B5 PB7 (io), B6 PB6 (io), B7 PG15 (io), B8 PG12 (io), B9 PG11 (io), B10 PG10 (io), B11 PD6 (io), B12 PD0 (io), B13 PC11 (io), B14 PC10 (io), B15 PA12 (io), C1 VBAT (power), C2 PI7 (io), C3 PI6 (io), C4 PI5 (io), C5 VDD (power), C6 PDR_ON (in), C7 VDD (power), C8 VDD (power), C9 VDD (power), C10 PG9 (io), C11 PD5 (io), C12 PD1 (io), C13 PI3 (io), C14 NC (in) hidden, C15 PA11 (io), D1 PC13 (io), D2 PI8 (io), D3 PI9 (io), D4 PI4 (io), D5 VSS (power), D6 BOOT0 (in), D7 VSS (power), D8 VSS (power), D9 VSS (power), D10 PD4 (io), D11 PD3 (io), D12 PD2 (io), D13 VDD12DSI (power), D14 PI1 (io), D15 PA10 (io), E1 PC14 (io), E2 PF0 (io), E3 PI10 (io), E4 PI11 (io), E12 DSIHOST_D1P (io), E13 DSIHOST_D1N (io), E14 PI0 (io), E15 PA9 (io), F1 PC15 (io), F2 VSS (power), F3 VDD (power), F4 PH2 (io), F6 VSS (power), F7 VSS (power), F8 VSS (power), F9 VSS (power), F10 VSS (power), F12 VSS (power), F13 VCAP2 (power), F14 PC9 (io), F15 PA8 (io), G1 PH0 (in), G2 VSS (power), G3 VDD (power), G4 PH3 (io), G6 VSS (power), G7 VSS (power), G8 VSS (power), G9 VSS (power), G10 VSS (power), G12 VSS (power), G13 VDD (power), G14 PC8 (io), G15 PC7 (io), H1 PH1 (in), H2 PF2 (io), H3 PF1 (io), H4 PH4 (io), H6 VSS (power), H7 VSS (power), H8 VSS (power), H9 VSS (power), H10 VSS (power), H12 VSSDSI (power), H13 VDDUSB (power), H14 PG8 (io), H15 PC6 (io), J1 NRST (in), J2 PF3 (io), J3 PF4 (io), J4 PH5 (io), J6 VSS (power), J7 VSS (power), J8 VSS (power), J9 VSS (power), J10 VSS (power), J12 VDDDSI (power), J13 VDD (power), J14 PG7 (io), J15 PG6 (io), K1 PF7 (io), K2 PF6 (io), K3 PF5 (io), K4 VDD (power), K6 VSS (power), K7 VSS (power), K8 VSS (power), K9 VSS (power), K10 VSS (power), K12 VCAPDSI (power), K13 PG5 (io), K14 PG4 (io), K15 PG3 (io), L1 PF10 (io), L2 PF9 (io), L3 PF8 (io), L4 BYPASS_REG (in), L12 DSIHOST_CKP (io), L13 DSIHOST_CKN (io), L14 PD15 (io), L15 PG2 (io), M1 VSSA (power), M2 PC0 (io), M3 PC1 (io), M4 PC2 (io), M5 PC3 (io), M6 PB2 (io), M7 PG1 (io), M8 VSS (power), M9 VSS (power), M10 VCAP1 (power), M11 PH6 (io), M12 DSIHOST_D0P (io), M13 DSIHOST_D0N (io), M14 PD14 (io), M15 PD13 (io), N1 VREF- (power), N2 PA1 (io), N3 PA0 (io), N4 PA4 (io), N5 PC4 (io), N6 PF13 (io), N7 PG0 (io), N8 VDD (power), N9 VDD (power), N10 VDD (power), N11 PE13 (io), N12 PH7 (io), N13 PD12 (io), N14 PD11 (io), N15 PD10 (io), P1 VREF+ (power), P2 PA2 (io), P3 PA6 (io), P4 PA5 (io), P5 PC5 (io), P6 PF12 (io), P7 PF15 (io), P8 PE8 (io), P9 PE9 (io), P10 PE11 (io), P11 PE14 (io), P12 PB12 (io), P13 PB13 (io), P14 PD9 (io), P15 PD8 (io), R1 VDDA (power), R2 PA3 (io), R3 PA7 (io), R4 PB1 (io), R5 PB0 (io), R6 PF11 (io), R7 PF14 (io), R8 PE7 (io), R9 PE10 (io), R10 PE12 (io), R11 PE15 (io), R12 PB10 (io), R13 PB11 (io), R14 PB14 (io), R15 PB15 (io)